# Altium footprint library Footprint.PcbLib: 55 footprints (part 3 of 4)
Each footprint in its own frame and in the unit in brackets; x right, y up, seen from the top. Pads: shape width x height; smd on the part's side, far side on the other; paste and mask are expansions set on the pad; w line width, h text height; cw(c..) or ccw(c..) is an arc to the next point about the centre after c.
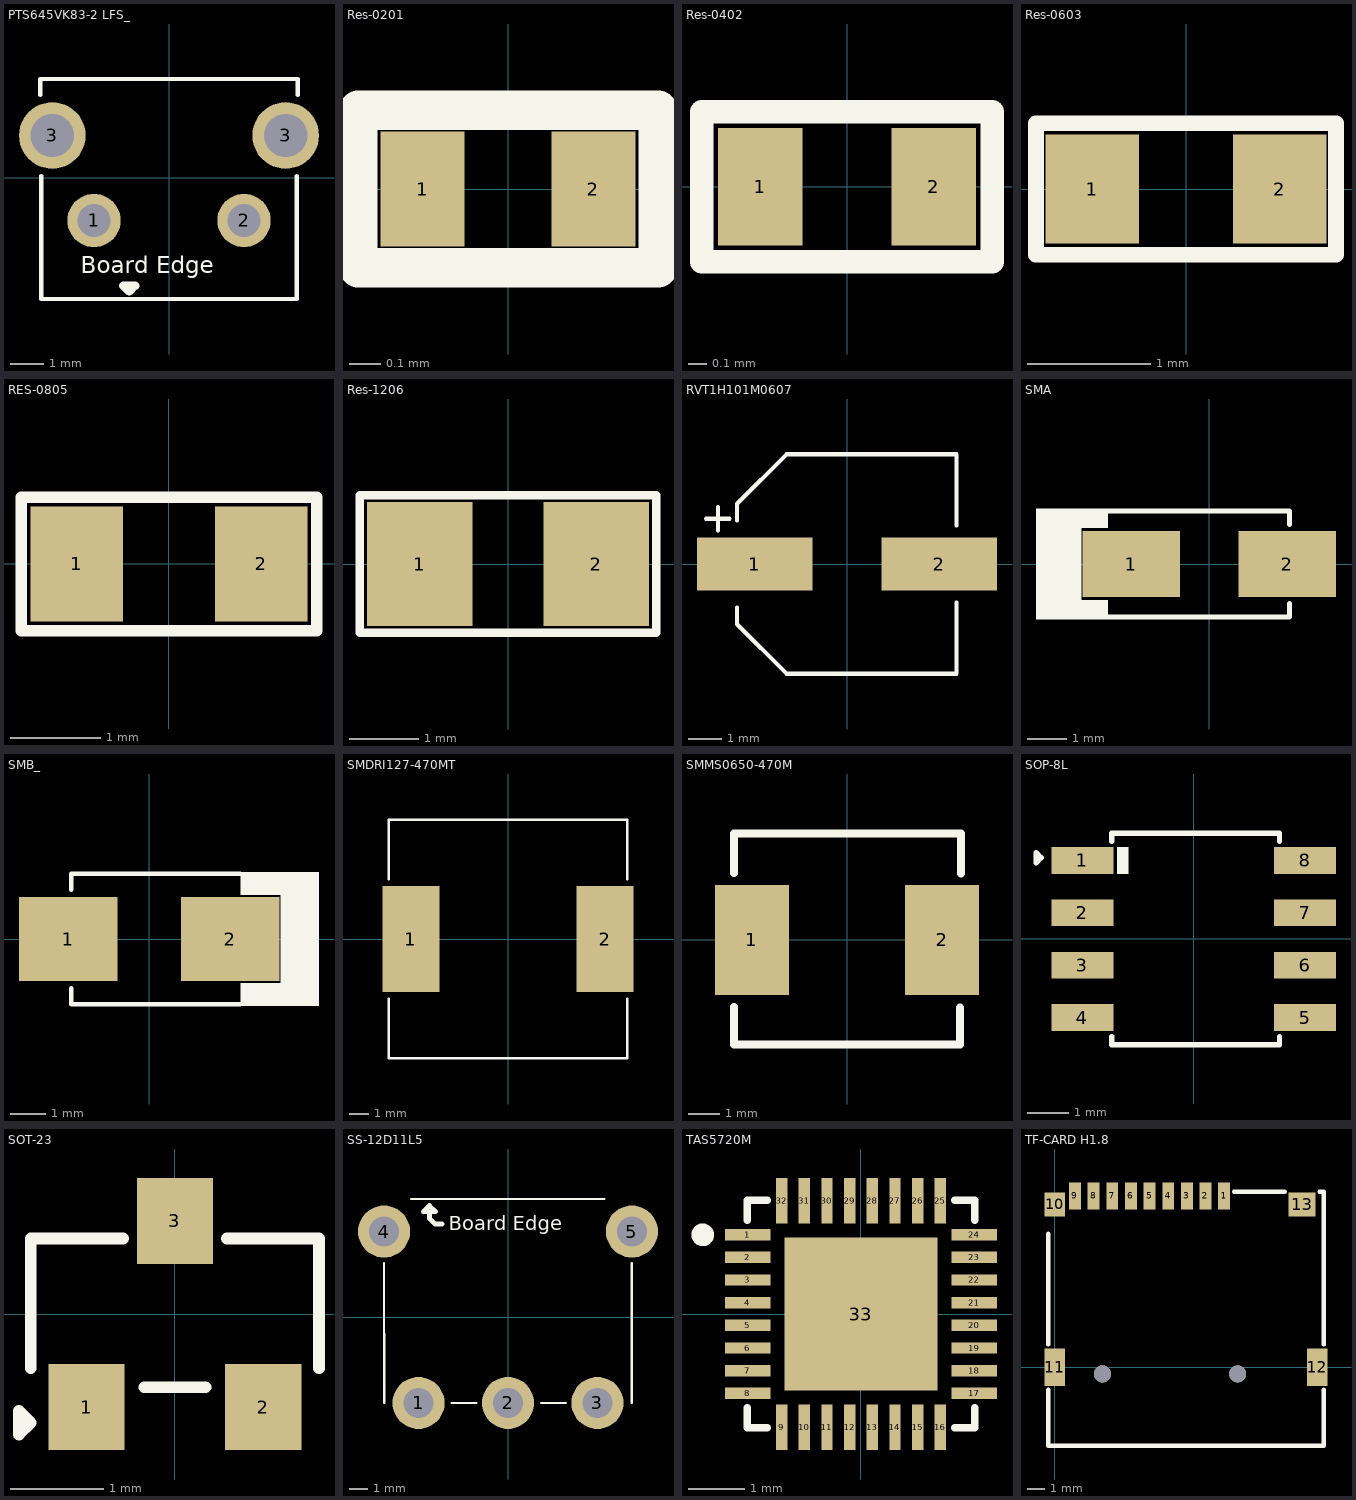
[diagram p2: the footprints below, top view; thin cyan lines are the x and y axes]

## PTS645VK83-2 LFS_ [mm]
pads (4):
  round 1.6 hole 1: 1(-2.25,-1.275) 2(2.25,-1.275)
  round 2 hole 1.3: 3(-3.5,1.275) 3(3.5,1.275)
Top Overlay:
  lines w0.127: -3.861,2.489 -3.861,2.972 3.861,2.972 3.861,2.489 ; -3.835,0.061 -3.835,-3.632 3.835,-3.632 3.835,0.061 3.835,-3.175
  lines w0.254: -1.372,-3.226 -1.194,-3.404 -1.016,-3.226 -1.372,-3.226
  text "Board Edge" at -2.642,-2.853 h0.51
3D body "PTS645VK83-2LFS.stp": height 7.5, standoff -3.85, extent -4.247,-9.579 4.247,2.921

## Res-0201 [mm]
pads (2):
  rect 0.27x0.37 smd mask+0.055: 1(-0.275,0) 2(0.275,0)
Top Overlay:
  lines w0.127: -0.483,-0.254 0.483,-0.254 0.483,0.254 -0.483,0.254 -0.483,-0.254
3D body "User Library-0201(0603M) Res.step": height 0.29, standoff -0.02, extent -0.305,-0.152 0.305,0.153

## Res-0402 [mil]
pads (2):
  rect 18x25 smd mask+2.17: 1(-18.5,0) 2(18.5,0)
Top Overlay:
  lines w0.13: -32,-17 32,-17
  lines w5: -31,-16 -31,16 31,16 31,-16 -31,-16
3D body "User Library-RES_1005-0402.step": height 16.14, standoff 0, extent -22.63,-10.82 22.64,10.83

## Res-0603 [mil]
pads (2):
  rect 30x35 smd: 1(-30,0) 2(30,0)
Top Overlay:
  lines w5: -48,-21 48,-21 48,21 -48,21 -48,-21
3D body "User Library-RESC1608X05N.step": height 17.76, standoff 0, extent -30.52,-16.74 30.51,16.73

## RES-0805 [mil] "SMD 0805"
pads (2):
  rect 40x50 smd: 1(-40,0) 2(40,0)
Top Overlay:
  lines w5: -64,-29 -64,29 64,29 64,-29 -64,-29
3D body "User Library-CR2012-0805.STEP": height 23.62, standoff 0, extent -39.34,-24.75 39.4,24.46

## Res-1206 [mil]
pads (2):
  rect 60x70 smd: 1(-50,0) 2(50,0)
Top Overlay:
  lines w5: -84,-39 84,-39 84,39 -84,39 -84,-39
3D body "User Library-CR3216-1206.step": height 23.62, standoff 0, extent -62.99,-31.5 62.99,31.5

## RVT1H101M0607 [mm]
pads (2):
  rect 3.5x1.6 smd: 1(-2.8,0) 2(2.8,0)
Top Overlay:
  lines w0.127: -4.273,1.372 -3.562,1.372 ; -3.918,1.016 -3.918,1.727 ; -3.333,-1.321 -3.333,-1.829 -1.835,-3.327 3.321,-3.327 3.321,-1.168 ; -3.333,1.321 -3.333,1.829 -1.835,3.327 3.321,3.327 3.321,1.168
3D body "RVT1C471M0607.STEP": height 7.94, standoff -0.01, extent -3.306,-3.325 3.294,3.275

## SMA [mm]
pads (2):
  rect 2.5x1.7 smd: 1(-2,0) 2(2,0)
Top Overlay:
  rectangle: -3.3,-1.422 -2.596,-0.924
  rectangle: -4.445,-1.422 -3.278,1.422
  rectangle: -3.3,0.924 -2.596,1.422
  lines w0.127: -2.658,-1.358 2.061,-1.358 2.061,-1.012 ; -2.658,1.358 2.061,1.358 2.061,1.012
3D body "User Library-DO-214AC SMA.step": height 2.4, standoff 0, extent -2.6,-1.3 2.6,1.3

## SMB_ [mm]
pads (2):
  rect 2.8x2.4 smd: 1(-2.3,0) 2(2.3,0)
Top Overlay:
  rectangle: 2.591,1.245 4.826,1.905
  rectangle: 3.734,-1.651 4.826,1.346
  rectangle: 2.591,-1.905 4.826,-1.245
  lines w0.127: -2.21,-1.397 -2.21,-1.854 2.591,-1.854 ; -2.21,1.397 -2.21,1.854 2.591,1.854
3D body "User Library-DO-214AA SMB.step": height 2.3, standoff 0, extent -2.7,-1.8 2.7,1.8

## SMDRI127-470MT [mm]
pads (2):
  rect 2.9x5.4 smd: 1(-4.95,0) 2(4.95,0)
Top Overlay:
  lines w0.127: -6.074,-3.051 -6.074,-6.074 6.071,-6.074 ; -6.074,3.051 -6.074,6.074 6.071,6.074 ; 6.074,-6.074 6.074,-3.051 ; 6.074,3.051 6.074,6.074
3D body "SHOU HAN CYH127-33UH.STEP": height 8.08, standoff 0.08, extent -6,-6 6,6

## SMMS0650-470M [mm]
pads (2):
  rect 2.35x3.5 smd: 1(-3.025,0) 2(3.025,0)
Top Overlay:
  lines w0.254: -3.6,-2.136 -3.6,-3.327 3.6,-3.327 3.6,-2.159 ; -3.6,2.134 -3.6,3.378 3.6,3.378 ; 3.623,2.116 3.623,3.378
3D body: height 5, standoff 0, extent -3.607,-3.327 3.632,3.378
3D body: height 0.7, standoff 0, extent 2.146,-1.5 3.746,1.5
3D body: height 0.7, standoff 0, extent -3.746,-1.5 -2.146,1.5

## SOP-8L [mm]
pads (8):
  rect 1.5x0.65 smd: 1(-2.7,1.905) 2(-2.7,0.635) 3(-2.7,-0.635) 4(-2.7,-1.905) 5(2.7,-1.905) 6(2.7,-0.635) 7(2.7,0.635) 8(2.7,1.905)
Top Overlay:
  rectangle: -1.855,1.575 -1.576,2.235
  lines w0.127: -1.986,-2.362 -1.986,-2.565 2.078,-2.565 2.078,-2.362 ; -1.986,2.362 -1.986,2.565 2.078,2.565 2.078,2.362 ; -3.823,1.841 -3.696,1.968 -3.823,2.095 -3.823,1.841
3D body "TRANS_IRF7103TRPBF_INF.step": height 1.76, standoff 0, extent -3.099,-2.502 3.099,2.502

## SOT-23 [mm] "TRANS NPN 40V 0.6A SOT23"
pads (3):
  rect 0.82x0.92 smd: 1(-0.95,-1) 2(0.95,-1) 3(0,1)
Top Overlay:
  lines w0.127: -1.549,-0.584 -1.549,0.813 -0.559,0.813 ; -0.33,-0.787 0.33,-0.787 ; 0.559,0.813 1.549,0.813 1.549,-0.584 ; -1.676,-1.295 -1.549,-1.168 -1.676,-1.041 -1.676,-1.295
3D body "CircuitWorks-SOT-23.step": height 1.05, standoff -0.05, extent -1.5,-1.25 1.5,1.25

## SS-12D11L5 [mm]
pads (5):
  round 2.8 hole 1.6: 1(-4.8,-4.6) 2(0,-4.6) 3(4.8,-4.6) 4(-6.65,4.6) 5(6.65,4.6)
Top Overlay:
  lines w0.127: -6.655,2.896 -6.65,-4.6 ; -5.207,6.35 5.182,6.35 ; -3.022,-4.6 -1.704,-4.6 ; 1.778,-4.6 3.096,-4.6 ; 6.645,2.896 6.65,-4.6
  lines w0.254: -4.216,5.664 -4.216,5.301 -3.924,5.009 -3.544,5.009 ; -4.547,5.664 -3.886,5.664 -4.216,5.994 -4.547,5.664
  text "Board Edge" at -3.188,4.663 h0.76
3D body "SS-12D11L5.STEP": height 7.1, standoff -2.8, extent -6.699,-5.213 6.801,13.237

## TAS5720M [mm]
pads (33):
  rect 0.8x0.2 smd mask+0.08: 1(-2,1.4) 2(-2,1) 3(-2,0.6) 4(-2,0.2) 5(-2,-0.2) 6(-2,-0.6) 7(-2,-1) 8(-2,-1.4) 17(2,-1.4) 18(2,-1) 19(2,-0.6) 20(2,-0.2) 21(2,0.2) 22(2,0.6) 23(2,1) 24(2,1.4)
  rect 0.2x0.8 smd mask+0.08: 9(-1.4,-2) 10(-1,-2) 11(-0.6,-2) 12(-0.2,-2) 13(0.2,-2) 14(0.6,-2) 15(1,-2) 16(1.4,-2) 25(1.4,2) 26(1,2) 27(0.6,2) 28(0.2,2) 29(-0.2,2) 30(-0.6,2) 31(-1,2) 32(-1.4,2)
  rect 2.7x2.7 smd: 33(0,0)
Top Overlay:
  circle w0.2: c-2.794,1.397 r0.1
  lines w0.127: -2.007,-1.653 -2.007,-2.007 -1.651,-2.007 ; -2.007,1.653 -2.007,2.007 -1.651,2.007 ; 1.651,-2.007 2.007,-2.007 2.007,-1.653 ; 1.651,2.007 2.007,2.007 2.007,1.653
3D body "step_temp.STEP": height 1, standoff 0, extent -2,-2 2,2

## TF-CARD H1.8 [mm]
pads (15):
  rect 0.7x1.6 smd paste+0 mask+0.05: 1(10,10.1) 2(8.9,10.1) 3(7.8,10.1) 4(6.7,10.1) 5(5.6,10.1) 6(4.5,10.1) 7(3.4,10.1) 8(2.3,10.1) 9(1.2,10.1)
  rect 1.2x1.4 smd paste+0 mask+0.05: 10(0.003,9.6)
  rect 1.2x2.2 smd paste+0 mask+0.05: 11(0,0) 12(15.5,0)
  rect 1.6x1.4 smd paste+0 mask+0.05: 13(14.6,9.6)
  round 1 hole 1 unplated paste+0: ""(2.82,-0.4) ""(10.8,-0.4)
Top Overlay:
  lines w0.254: -0.378,-1.331 -0.378,-4.632 15.878,-4.632 15.878,-1.331 ; -0.378,1.331 -0.378,7.869 ; 10.581,10.354 13.575,10.354 ; 15.625,10.354 15.878,10.354 15.878,1.331
Mechanical 15:
  circle w0.4: c10.8,-0.4 r0.2
  circle w0.4: c2.82,-0.4 r0.2